# Altium footprint library ST封装.PcbLib: 1336 footprints (part 78 of 109)
Each footprint in its own frame and in the unit in brackets; x right, y up, seen from the top. Pads: shape width x height; smd on the part's side, far side on the other; paste and mask are expansions set on the pad; w line width, h text height; cw(c..) or ccw(c..) is an arc to the next point about the centre after c.
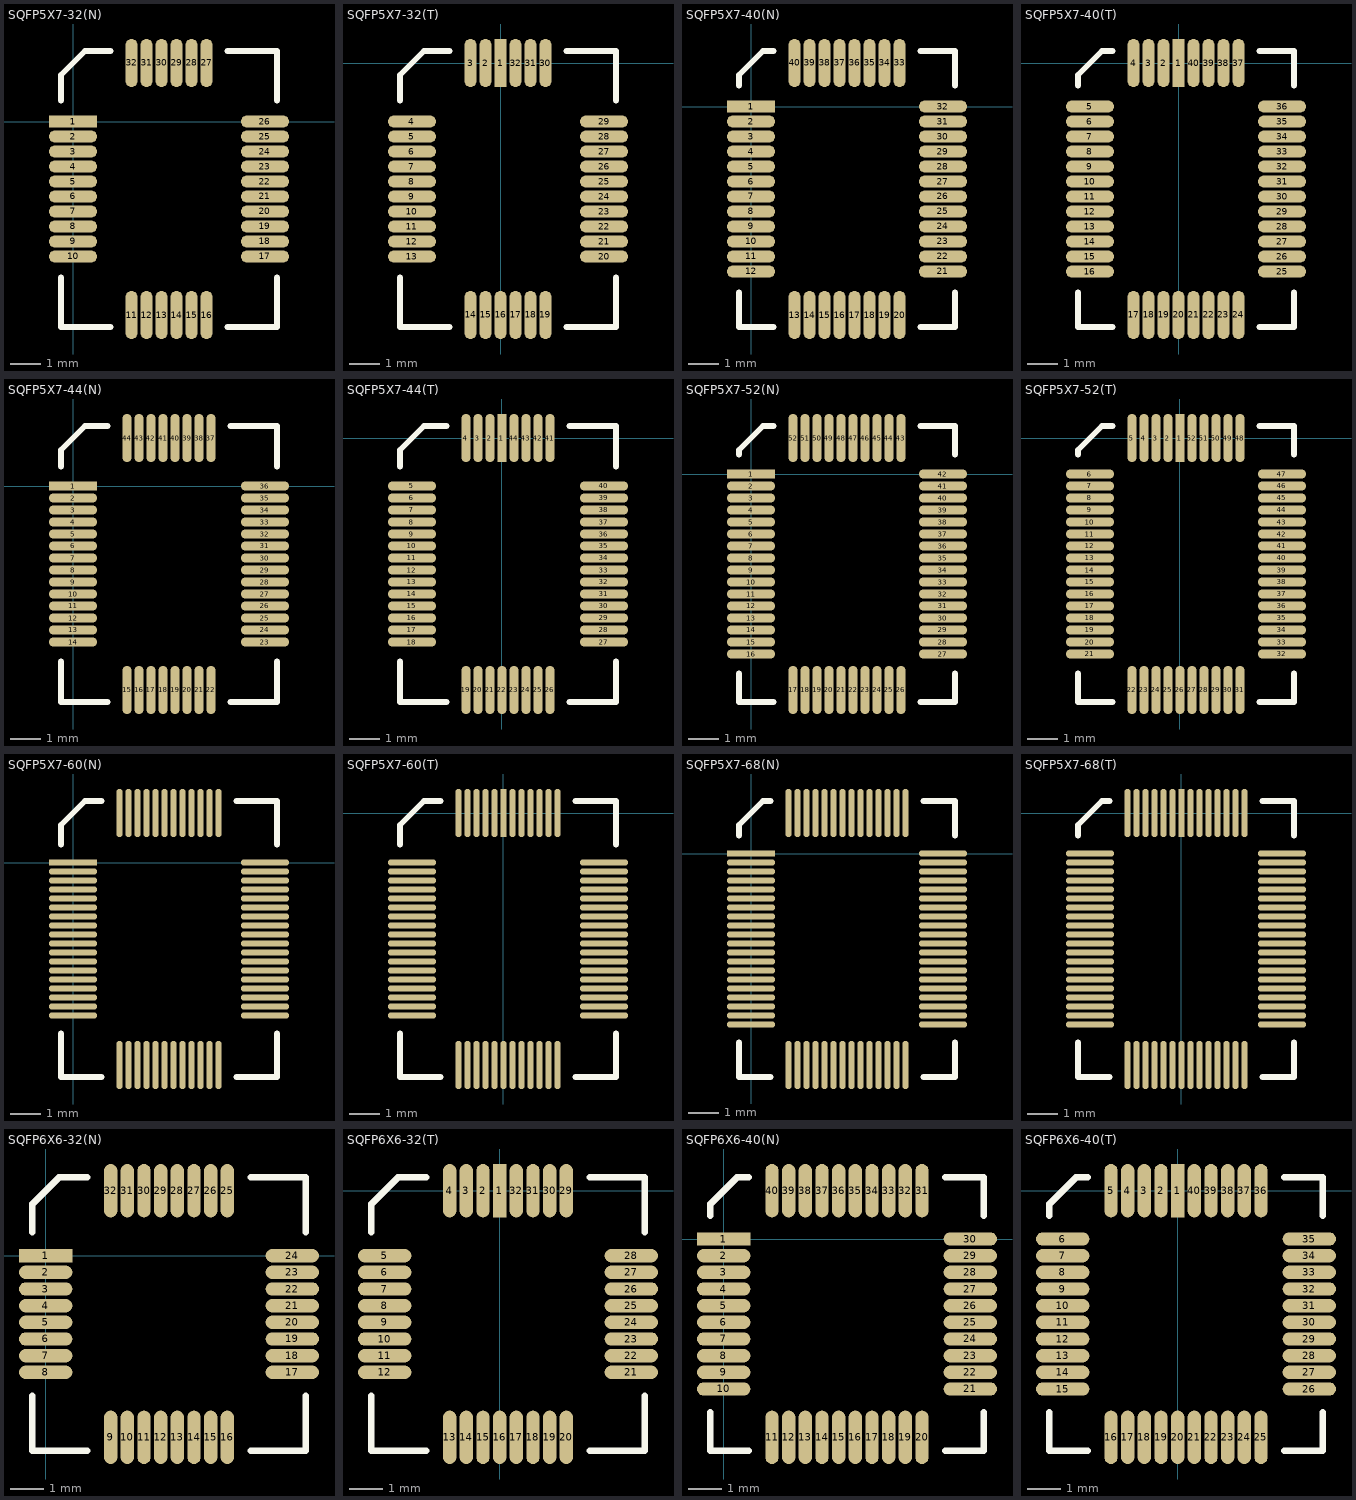
[diagram p77: the footprints below, top view; thin cyan lines are the x and y axes]

## SQFP5X7-32(N) [mm]
pads (32):
  rect 1.6x0.4 smd: 1(0,0)
  oval 1.6x0.4 smd: 2(0,-0.5) 3(0,-1) 4(0,-1.5) 5(0,-2) 6(0,-2.5) 7(0,-3) 8(0,-3.5) 9(0,-4) 10(0,-4.5) 17(6.4,-4.5) 18(6.4,-4) 19(6.4,-3.5) 20(6.4,-3) 21(6.4,-2.5) 22(6.4,-2) 23(6.4,-1.5) 24(6.4,-1) 25(6.4,-0.5) 26(6.4,0)
  oval 0.4x1.6 smd: 11(1.95,-6.45) 12(2.45,-6.45) 13(2.95,-6.45) 14(3.45,-6.45) 15(3.95,-6.45) 16(4.45,-6.45) 27(4.45,1.95) 28(3.95,1.95) 29(3.45,1.95) 30(2.95,1.95) 31(2.45,1.95) 32(1.95,1.95)
Top Overlay:
  lines w0.2: -0.4,-5.2 -0.4,-6.85 1.25,-6.85 ; -0.4,0.7 -0.4,1.55 0.4,2.35 1.25,2.35 ; 5.15,-6.85 6.8,-6.85 6.8,-5.2 ; 5.15,2.35 6.8,2.35 6.8,0.7

## SQFP5X7-32(T) [mm]
pads (32):
  rect 0.4x1.6 smd: 1(0,0)
  oval 0.4x1.6 smd: 2(-0.5,0) 3(-1,0) 14(-1,-8.4) 15(-0.5,-8.4) 16(0,-8.4) 17(0.5,-8.4) 18(1,-8.4) 19(1.5,-8.4) 30(1.5,0) 31(1,0) 32(0.5,0)
  oval 1.6x0.4 smd: 4(-2.95,-1.95) 5(-2.95,-2.45) 6(-2.95,-2.95) 7(-2.95,-3.45) 8(-2.95,-3.95) 9(-2.95,-4.45) 10(-2.95,-4.95) 11(-2.95,-5.45) 12(-2.95,-5.95) 13(-2.95,-6.45) 20(3.45,-6.45) 21(3.45,-5.95) 22(3.45,-5.45) 23(3.45,-4.95) 24(3.45,-4.45) 25(3.45,-3.95) 26(3.45,-3.45) 27(3.45,-2.95) 28(3.45,-2.45) 29(3.45,-1.95)
Top Overlay:
  lines w0.2: -3.35,-7.15 -3.35,-8.8 -1.7,-8.8 ; -3.35,-1.25 -3.35,-0.4 -2.55,0.4 -1.7,0.4 ; 2.2,-8.8 3.85,-8.8 3.85,-7.15 ; 2.2,0.4 3.85,0.4 3.85,-1.25

## SQFP5X7-40(N) [mm]
pads (40):
  rect 1.6x0.4 smd: 1(0,0)
  oval 1.6x0.4 smd: 2(0,-0.5) 3(0,-1) 4(0,-1.5) 5(0,-2) 6(0,-2.5) 7(0,-3) 8(0,-3.5) 9(0,-4) 10(0,-4.5) 11(0,-5) 12(0,-5.5) 21(6.4,-5.5) 22(6.4,-5) 23(6.4,-4.5) 24(6.4,-4) 25(6.4,-3.5) 26(6.4,-3) 27(6.4,-2.5) 28(6.4,-2) 29(6.4,-1.5) 30(6.4,-1) 31(6.4,-0.5) 32(6.4,0)
  oval 0.4x1.6 smd: 13(1.45,-6.95) 14(1.95,-6.95) 15(2.45,-6.95) 16(2.95,-6.95) 17(3.45,-6.95) 18(3.95,-6.95) 19(4.45,-6.95) 20(4.95,-6.95) 33(4.95,1.45) 34(4.45,1.45) 35(3.95,1.45) 36(3.45,1.45) 37(2.95,1.45) 38(2.45,1.45) 39(1.95,1.45) 40(1.45,1.45)
Top Overlay:
  lines w0.2: -0.4,-6.2 -0.4,-7.35 0.75,-7.35 ; -0.4,0.7 -0.4,1.05 0.4,1.85 0.75,1.85 ; 5.65,-7.35 6.8,-7.35 6.8,-6.2 ; 5.65,1.85 6.8,1.85 6.8,0.7

## SQFP5X7-40(T) [mm]
pads (40):
  rect 0.4x1.6 smd: 1(0,0)
  oval 0.4x1.6 smd: 2(-0.5,0) 3(-1,0) 4(-1.5,0) 17(-1.5,-8.4) 18(-1,-8.4) 19(-0.5,-8.4) 20(0,-8.4) 21(0.5,-8.4) 22(1,-8.4) 23(1.5,-8.4) 24(2,-8.4) 37(2,0) 38(1.5,0) 39(1,0) 40(0.5,0)
  oval 1.6x0.4 smd: 5(-2.95,-1.45) 6(-2.95,-1.95) 7(-2.95,-2.45) 8(-2.95,-2.95) 9(-2.95,-3.45) 10(-2.95,-3.95) 11(-2.95,-4.45) 12(-2.95,-4.95) 13(-2.95,-5.45) 14(-2.95,-5.95) 15(-2.95,-6.45) 16(-2.95,-6.95) 25(3.45,-6.95) 26(3.45,-6.45) 27(3.45,-5.95) 28(3.45,-5.45) 29(3.45,-4.95) 30(3.45,-4.45) 31(3.45,-3.95) 32(3.45,-3.45) 33(3.45,-2.95) 34(3.45,-2.45) 35(3.45,-1.95) 36(3.45,-1.45)
Top Overlay:
  lines w0.2: -3.35,-7.65 -3.35,-8.8 -2.2,-8.8 ; -3.35,-0.75 -3.35,-0.4 -2.55,0.4 -2.2,0.4 ; 2.7,-8.8 3.85,-8.8 3.85,-7.65 ; 2.7,0.4 3.85,0.4 3.85,-0.75

## SQFP5X7-44(N) [mm]
pads (44):
  rect 1.6x0.3 smd: 1(0,0)
  oval 1.6x0.3 smd: 2(0,-0.4) 3(0,-0.8) 4(0,-1.2) 5(0,-1.6) 6(0,-2) 7(0,-2.4) 8(0,-2.8) 9(0,-3.2) 10(0,-3.6) 11(0,-4) 12(0,-4.4) 13(0,-4.8) 14(0,-5.2) 23(6.4,-5.2) 24(6.4,-4.8) 25(6.4,-4.4) 26(6.4,-4) 27(6.4,-3.6) 28(6.4,-3.2) 29(6.4,-2.8) 30(6.4,-2.4) 31(6.4,-2) 32(6.4,-1.6) 33(6.4,-1.2) 34(6.4,-0.8) 35(6.4,-0.4) 36(6.4,0)
  oval 0.3x1.6 smd: 15(1.8,-6.8) 16(2.2,-6.8) 17(2.6,-6.8) 18(3,-6.8) 19(3.4,-6.8) 20(3.8,-6.8) 21(4.2,-6.8) 22(4.6,-6.8) 37(4.6,1.6) 38(4.2,1.6) 39(3.8,1.6) 40(3.4,1.6) 41(3,1.6) 42(2.6,1.6) 43(2.2,1.6) 44(1.8,1.6)
Top Overlay:
  lines w0.2: -0.4,-5.85 -0.4,-7.2 1.15,-7.2 ; -0.4,0.65 -0.4,1.2 0.4,2 1.15,2 ; 5.25,-7.2 6.8,-7.2 6.8,-5.85 ; 5.25,2 6.8,2 6.8,0.65

## SQFP5X7-44(T) [mm]
pads (44):
  rect 0.3x1.6 smd: 1(0,0)
  oval 0.3x1.6 smd: 2(-0.4,0) 3(-0.8,0) 4(-1.2,0) 19(-1.2,-8.4) 20(-0.8,-8.4) 21(-0.4,-8.4) 22(0,-8.4) 23(0.4,-8.4) 24(0.8,-8.4) 25(1.2,-8.4) 26(1.6,-8.4) 41(1.6,0) 42(1.2,0) 43(0.8,0) 44(0.4,0)
  oval 1.6x0.3 smd: 5(-3,-1.6) 6(-3,-2) 7(-3,-2.4) 8(-3,-2.8) 9(-3,-3.2) 10(-3,-3.6) 11(-3,-4) 12(-3,-4.4) 13(-3,-4.8) 14(-3,-5.2) 15(-3,-5.6) 16(-3,-6) 17(-3,-6.4) 18(-3,-6.8) 27(3.4,-6.8) 28(3.4,-6.4) 29(3.4,-6) 30(3.4,-5.6) 31(3.4,-5.2) 32(3.4,-4.8) 33(3.4,-4.4) 34(3.4,-4) 35(3.4,-3.6) 36(3.4,-3.2) 37(3.4,-2.8) 38(3.4,-2.4) 39(3.4,-2) 40(3.4,-1.6)
Top Overlay:
  lines w0.2: -3.4,-7.45 -3.4,-8.8 -1.85,-8.8 ; -3.4,-0.95 -3.4,-0.4 -2.6,0.4 -1.85,0.4 ; 2.25,-8.8 3.8,-8.8 3.8,-7.45 ; 2.25,0.4 3.8,0.4 3.8,-0.95

## SQFP5X7-52(N) [mm]
pads (52):
  rect 1.6x0.3 smd: 1(0,0)
  oval 1.6x0.3 smd: 2(0,-0.4) 3(0,-0.8) 4(0,-1.2) 5(0,-1.6) 6(0,-2) 7(0,-2.4) 8(0,-2.8) 9(0,-3.2) 10(0,-3.6) 11(0,-4) 12(0,-4.4) 13(0,-4.8) 14(0,-5.2) 15(0,-5.6) 16(0,-6) 27(6.4,-6) 28(6.4,-5.6) 29(6.4,-5.2) 30(6.4,-4.8) 31(6.4,-4.4) 32(6.4,-4) 33(6.4,-3.6) 34(6.4,-3.2) 35(6.4,-2.8) 36(6.4,-2.4) 37(6.4,-2) 38(6.4,-1.6) 39(6.4,-1.2) 40(6.4,-0.8) 41(6.4,-0.4) 42(6.4,0)
  oval 0.3x1.6 smd: 17(1.4,-7.2) 18(1.8,-7.2) 19(2.2,-7.2) 20(2.6,-7.2) 21(3,-7.2) 22(3.4,-7.2) 23(3.8,-7.2) 24(4.2,-7.2) 25(4.6,-7.2) 26(5,-7.2) 43(5,1.2) 44(4.6,1.2) 45(4.2,1.2) 46(3.8,1.2) 47(3.4,1.2) 48(3,1.2) 49(2.6,1.2) 50(2.2,1.2) 51(1.8,1.2) 52(1.4,1.2)
Top Overlay:
  lines w0.2: -0.4,-6.65 -0.4,-7.6 0.75,-7.6 ; -0.4,0.65 -0.4,0.8 0.4,1.6 0.75,1.6 ; 5.65,-7.6 6.8,-7.6 6.8,-6.65 ; 5.65,1.6 6.8,1.6 6.8,0.65

## SQFP5X7-52(T) [mm]
pads (52):
  rect 0.3x1.6 smd: 1(0,0)
  oval 0.3x1.6 smd: 2(-0.4,0) 3(-0.8,0) 4(-1.2,0) 5(-1.6,0) 22(-1.6,-8.4) 23(-1.2,-8.4) 24(-0.8,-8.4) 25(-0.4,-8.4) 26(0,-8.4) 27(0.4,-8.4) 28(0.8,-8.4) 29(1.2,-8.4) 30(1.6,-8.4) 31(2,-8.4) 48(2,0) 49(1.6,0) 50(1.2,0) 51(0.8,0) 52(0.4,0)
  oval 1.6x0.3 smd: 6(-3,-1.2) 7(-3,-1.6) 8(-3,-2) 9(-3,-2.4) 10(-3,-2.8) 11(-3,-3.2) 12(-3,-3.6) 13(-3,-4) 14(-3,-4.4) 15(-3,-4.8) 16(-3,-5.2) 17(-3,-5.6) 18(-3,-6) 19(-3,-6.4) 20(-3,-6.8) 21(-3,-7.2) 32(3.4,-7.2) 33(3.4,-6.8) 34(3.4,-6.4) 35(3.4,-6) 36(3.4,-5.6) 37(3.4,-5.2) 38(3.4,-4.8) 39(3.4,-4.4) 40(3.4,-4) 41(3.4,-3.6) 42(3.4,-3.2) 43(3.4,-2.8) 44(3.4,-2.4) 45(3.4,-2) 46(3.4,-1.6) 47(3.4,-1.2)
Top Overlay:
  lines w0.2: -3.4,-7.85 -3.4,-8.8 -2.25,-8.8 ; -3.4,-0.55 -3.4,-0.4 -2.6,0.4 -2.25,0.4 ; 2.65,-8.8 3.8,-8.8 3.8,-7.85 ; 2.65,0.4 3.8,0.4 3.8,-0.55

## SQFP5X7-60(N) [mm]
pads (60):
  rect 1.6x0.2 smd: 1(0,0)
  oval 1.6x0.2 smd: 2(0,-0.3) 3(0,-0.6) 4(0,-0.9) 5(0,-1.2) 6(0,-1.5) 7(0,-1.8) 8(0,-2.1) 9(0,-2.4) 10(0,-2.7) 11(0,-3) 12(0,-3.3) 13(0,-3.6) 14(0,-3.9) 15(0,-4.2) 16(0,-4.5) 17(0,-4.8) 18(0,-5.1) 31(6.4,-5.1) 32(6.4,-4.8) 33(6.4,-4.5) 34(6.4,-4.2) 35(6.4,-3.9) 36(6.4,-3.6) 37(6.4,-3.3) 38(6.4,-3) 39(6.4,-2.7) 40(6.4,-2.4) 41(6.4,-2.1) 42(6.4,-1.8) 43(6.4,-1.5) 44(6.4,-1.2) 45(6.4,-0.9) 46(6.4,-0.6) 47(6.4,-0.3) 48(6.4,0)
  oval 0.2x1.6 smd: 19(1.55,-6.75) 20(1.85,-6.75) 21(2.15,-6.75) 22(2.45,-6.75) 23(2.75,-6.75) 24(3.05,-6.75) 25(3.35,-6.75) 26(3.65,-6.75) 27(3.95,-6.75) 28(4.25,-6.75) 29(4.55,-6.75) 30(4.85,-6.75) 49(4.85,1.65) 50(4.55,1.65) 51(4.25,1.65) 52(3.95,1.65) 53(3.65,1.65) 54(3.35,1.65) 55(3.05,1.65) 56(2.75,1.65) 57(2.45,1.65) 58(2.15,1.65) 59(1.85,1.65) 60(1.55,1.65)
Top Overlay:
  lines w0.2: -0.4,-5.7 -0.4,-7.15 0.95,-7.15 ; -0.4,0.6 -0.4,1.25 0.4,2.05 0.95,2.05 ; 5.45,-7.15 6.8,-7.15 6.8,-5.7 ; 5.45,2.05 6.8,2.05 6.8,0.6

## SQFP5X7-60(T) [mm]
pads (60):
  rect 0.2x1.6 smd: 1(0,0)
  oval 0.2x1.6 smd: 2(-0.3,0) 3(-0.6,0) 4(-0.9,0) 5(-1.2,0) 6(-1.5,0) 25(-1.5,-8.4) 26(-1.2,-8.4) 27(-0.9,-8.4) 28(-0.6,-8.4) 29(-0.3,-8.4) 30(0,-8.4) 31(0.3,-8.4) 32(0.6,-8.4) 33(0.9,-8.4) 34(1.2,-8.4) 35(1.5,-8.4) 36(1.8,-8.4) 55(1.8,0) 56(1.5,0) 57(1.2,0) 58(0.9,0) 59(0.6,0) 60(0.3,0)
  oval 1.6x0.2 smd: 7(-3.05,-1.65) 8(-3.05,-1.95) 9(-3.05,-2.25) 10(-3.05,-2.55) 11(-3.05,-2.85) 12(-3.05,-3.15) 13(-3.05,-3.45) 14(-3.05,-3.75) 15(-3.05,-4.05) 16(-3.05,-4.35) 17(-3.05,-4.65) 18(-3.05,-4.95) 19(-3.05,-5.25) 20(-3.05,-5.55) 21(-3.05,-5.85) 22(-3.05,-6.15) 23(-3.05,-6.45) 24(-3.05,-6.75) 37(3.35,-6.75) 38(3.35,-6.45) 39(3.35,-6.15) 40(3.35,-5.85) 41(3.35,-5.55) 42(3.35,-5.25) 43(3.35,-4.95) 44(3.35,-4.65) 45(3.35,-4.35) 46(3.35,-4.05) 47(3.35,-3.75) 48(3.35,-3.45) 49(3.35,-3.15) 50(3.35,-2.85) 51(3.35,-2.55) 52(3.35,-2.25) 53(3.35,-1.95) 54(3.35,-1.65)
Top Overlay:
  lines w0.2: -3.45,-7.35 -3.45,-8.8 -2.1,-8.8 ; -3.45,-1.05 -3.45,-0.4 -2.65,0.4 -2.1,0.4 ; 2.4,-8.8 3.75,-8.8 3.75,-7.35 ; 2.4,0.4 3.75,0.4 3.75,-1.05

## SQFP5X7-68(N) [mm]
pads (68):
  rect 1.6x0.2 smd: 1(0,0)
  oval 1.6x0.2 smd: 2(0,-0.3) 3(0,-0.6) 4(0,-0.9) 5(0,-1.2) 6(0,-1.5) 7(0,-1.8) 8(0,-2.1) 9(0,-2.4) 10(0,-2.7) 11(0,-3) 12(0,-3.3) 13(0,-3.6) 14(0,-3.9) 15(0,-4.2) 16(0,-4.5) 17(0,-4.8) 18(0,-5.1) 19(0,-5.4) 20(0,-5.7) 35(6.4,-5.7) 36(6.4,-5.4) 37(6.4,-5.1) 38(6.4,-4.8) 39(6.4,-4.5) 40(6.4,-4.2) 41(6.4,-3.9) 42(6.4,-3.6) 43(6.4,-3.3) 44(6.4,-3) 45(6.4,-2.7) 46(6.4,-2.4) 47(6.4,-2.1) 48(6.4,-1.8) 49(6.4,-1.5) 50(6.4,-1.2) 51(6.4,-0.9) 52(6.4,-0.6) 53(6.4,-0.3) 54(6.4,0)
  oval 0.2x1.6 smd: 21(1.25,-7.05) 22(1.55,-7.05) 23(1.85,-7.05) 24(2.15,-7.05) 25(2.45,-7.05) 26(2.75,-7.05) 27(3.05,-7.05) 28(3.35,-7.05) 29(3.65,-7.05) 30(3.95,-7.05) 31(4.25,-7.05) 32(4.55,-7.05) 33(4.85,-7.05) 34(5.15,-7.05) 55(5.15,1.35) 56(4.85,1.35) 57(4.55,1.35) 58(4.25,1.35) 59(3.95,1.35) 60(3.65,1.35) 61(3.35,1.35) 62(3.05,1.35) 63(2.75,1.35) 64(2.45,1.35) 65(2.15,1.35) 66(1.85,1.35) 67(1.55,1.35) 68(1.25,1.35)
Top Overlay:
  lines w0.2: -0.4,-6.3 -0.4,-7.45 0.65,-7.45 ; -0.4,0.6 -0.4,0.95 0.4,1.75 0.65,1.75 ; 5.75,-7.45 6.8,-7.45 6.8,-6.3 ; 5.75,1.75 6.8,1.75 6.8,0.6

## SQFP5X7-68(T) [mm]
pads (68):
  rect 0.2x1.6 smd: 1(0,0)
  oval 0.2x1.6 smd: 2(-0.3,0) 3(-0.6,0) 4(-0.9,0) 5(-1.2,0) 6(-1.5,0) 7(-1.8,0) 28(-1.8,-8.4) 29(-1.5,-8.4) 30(-1.2,-8.4) 31(-0.9,-8.4) 32(-0.6,-8.4) 33(-0.3,-8.4) 34(0,-8.4) 35(0.3,-8.4) 36(0.6,-8.4) 37(0.9,-8.4) 38(1.2,-8.4) 39(1.5,-8.4) 40(1.8,-8.4) 41(2.1,-8.4) 62(2.1,0) 63(1.8,0) 64(1.5,0) 65(1.2,0) 66(0.9,0) 67(0.6,0) 68(0.3,0)
  oval 1.6x0.2 smd: 8(-3.05,-1.35) 9(-3.05,-1.65) 10(-3.05,-1.95) 11(-3.05,-2.25) 12(-3.05,-2.55) 13(-3.05,-2.85) 14(-3.05,-3.15) 15(-3.05,-3.45) 16(-3.05,-3.75) 17(-3.05,-4.05) 18(-3.05,-4.35) 19(-3.05,-4.65) 20(-3.05,-4.95) 21(-3.05,-5.25) 22(-3.05,-5.55) 23(-3.05,-5.85) 24(-3.05,-6.15) 25(-3.05,-6.45) 26(-3.05,-6.75) 27(-3.05,-7.05) 42(3.35,-7.05) 43(3.35,-6.75) 44(3.35,-6.45) 45(3.35,-6.15) 46(3.35,-5.85) 47(3.35,-5.55) 48(3.35,-5.25) 49(3.35,-4.95) 50(3.35,-4.65) 51(3.35,-4.35) 52(3.35,-4.05) 53(3.35,-3.75) 54(3.35,-3.45) 55(3.35,-3.15) 56(3.35,-2.85) 57(3.35,-2.55) 58(3.35,-2.25) 59(3.35,-1.95) 60(3.35,-1.65) 61(3.35,-1.35)
Top Overlay:
  lines w0.2: -3.45,-7.65 -3.45,-8.8 -2.4,-8.8 ; -3.45,-0.75 -3.45,-0.4 -2.65,0.4 -2.4,0.4 ; 2.7,-8.8 3.75,-8.8 3.75,-7.65 ; 2.7,0.4 3.75,0.4 3.75,-0.75

## SQFP6X6-32(N) [mm]
pads (32):
  rect 1.6x0.4 smd: 1(0,0)
  oval 1.6x0.4 smd: 2(0,-0.5) 3(0,-1) 4(0,-1.5) 5(0,-2) 6(0,-2.5) 7(0,-3) 8(0,-3.5) 17(7.4,-3.5) 18(7.4,-3) 19(7.4,-2.5) 20(7.4,-2) 21(7.4,-1.5) 22(7.4,-1) 23(7.4,-0.5) 24(7.4,0)
  oval 0.4x1.6 smd: 9(1.95,-5.45) 10(2.45,-5.45) 11(2.95,-5.45) 12(3.45,-5.45) 13(3.95,-5.45) 14(4.45,-5.45) 15(4.95,-5.45) 16(5.45,-5.45) 25(5.45,1.95) 26(4.95,1.95) 27(4.45,1.95) 28(3.95,1.95) 29(3.45,1.95) 30(2.95,1.95) 31(2.45,1.95) 32(1.95,1.95)
Top Overlay:
  lines w0.2: -0.4,-4.2 -0.4,-5.85 1.25,-5.85 ; -0.4,0.7 -0.4,1.55 0.4,2.35 1.25,2.35 ; 6.15,-5.85 7.8,-5.85 7.8,-4.2 ; 6.15,2.35 7.8,2.35 7.8,0.7

## SQFP6X6-32(T) [mm]
pads (32):
  rect 0.4x1.6 smd: 1(0,0)
  oval 0.4x1.6 smd: 2(-0.5,0) 3(-1,0) 4(-1.5,0) 13(-1.5,-7.4) 14(-1,-7.4) 15(-0.5,-7.4) 16(0,-7.4) 17(0.5,-7.4) 18(1,-7.4) 19(1.5,-7.4) 20(2,-7.4) 29(2,0) 30(1.5,0) 31(1,0) 32(0.5,0)
  oval 1.6x0.4 smd: 5(-3.45,-1.95) 6(-3.45,-2.45) 7(-3.45,-2.95) 8(-3.45,-3.45) 9(-3.45,-3.95) 10(-3.45,-4.45) 11(-3.45,-4.95) 12(-3.45,-5.45) 21(3.95,-5.45) 22(3.95,-4.95) 23(3.95,-4.45) 24(3.95,-3.95) 25(3.95,-3.45) 26(3.95,-2.95) 27(3.95,-2.45) 28(3.95,-1.95)
Top Overlay:
  lines w0.2: -3.85,-6.15 -3.85,-7.8 -2.2,-7.8 ; -3.85,-1.25 -3.85,-0.4 -3.05,0.4 -2.2,0.4 ; 2.7,-7.8 4.35,-7.8 4.35,-6.15 ; 2.7,0.4 4.35,0.4 4.35,-1.25

## SQFP6X6-40(N) [mm]
pads (40):
  rect 1.6x0.4 smd: 1(0,0)
  oval 1.6x0.4 smd: 2(0,-0.5) 3(0,-1) 4(0,-1.5) 5(0,-2) 6(0,-2.5) 7(0,-3) 8(0,-3.5) 9(0,-4) 10(0,-4.5) 21(7.4,-4.5) 22(7.4,-4) 23(7.4,-3.5) 24(7.4,-3) 25(7.4,-2.5) 26(7.4,-2) 27(7.4,-1.5) 28(7.4,-1) 29(7.4,-0.5) 30(7.4,0)
  oval 0.4x1.6 smd: 11(1.45,-5.95) 12(1.95,-5.95) 13(2.45,-5.95) 14(2.95,-5.95) 15(3.45,-5.95) 16(3.95,-5.95) 17(4.45,-5.95) 18(4.95,-5.95) 19(5.45,-5.95) 20(5.95,-5.95) 31(5.95,1.45) 32(5.45,1.45) 33(4.95,1.45) 34(4.45,1.45) 35(3.95,1.45) 36(3.45,1.45) 37(2.95,1.45) 38(2.45,1.45) 39(1.95,1.45) 40(1.45,1.45)
Top Overlay:
  lines w0.2: -0.4,-5.2 -0.4,-6.35 0.75,-6.35 ; -0.4,0.7 -0.4,1.05 0.4,1.85 0.75,1.85 ; 6.65,-6.35 7.8,-6.35 7.8,-5.2 ; 6.65,1.85 7.8,1.85 7.8,0.7

## SQFP6X6-40(T) [mm]
pads (40):
  rect 0.4x1.6 smd: 1(0,0)
  oval 0.4x1.6 smd: 2(-0.5,0) 3(-1,0) 4(-1.5,0) 5(-2,0) 16(-2,-7.4) 17(-1.5,-7.4) 18(-1,-7.4) 19(-0.5,-7.4) 20(0,-7.4) 21(0.5,-7.4) 22(1,-7.4) 23(1.5,-7.4) 24(2,-7.4) 25(2.5,-7.4) 36(2.5,0) 37(2,0) 38(1.5,0) 39(1,0) 40(0.5,0)
  oval 1.6x0.4 smd: 6(-3.45,-1.45) 7(-3.45,-1.95) 8(-3.45,-2.45) 9(-3.45,-2.95) 10(-3.45,-3.45) 11(-3.45,-3.95) 12(-3.45,-4.45) 13(-3.45,-4.95) 14(-3.45,-5.45) 15(-3.45,-5.95) 26(3.95,-5.95) 27(3.95,-5.45) 28(3.95,-4.95) 29(3.95,-4.45) 30(3.95,-3.95) 31(3.95,-3.45) 32(3.95,-2.95) 33(3.95,-2.45) 34(3.95,-1.95) 35(3.95,-1.45)
Top Overlay:
  lines w0.2: -3.85,-6.65 -3.85,-7.8 -2.7,-7.8 ; -3.85,-0.75 -3.85,-0.4 -3.05,0.4 -2.7,0.4 ; 3.2,-7.8 4.35,-7.8 4.35,-6.65 ; 3.2,0.4 4.35,0.4 4.35,-0.75